# Altium footprint library IDETEC.PcbLib: 275 footprints (part 14 of 18)
Each footprint in its own frame and in the unit in brackets; x right, y up, seen from the top. Pads: shape width x height; smd on the part's side, far side on the other; paste and mask are expansions set on the pad; w line width, h text height; cw(c..) or ccw(c..) is an arc to the next point about the centre after c.
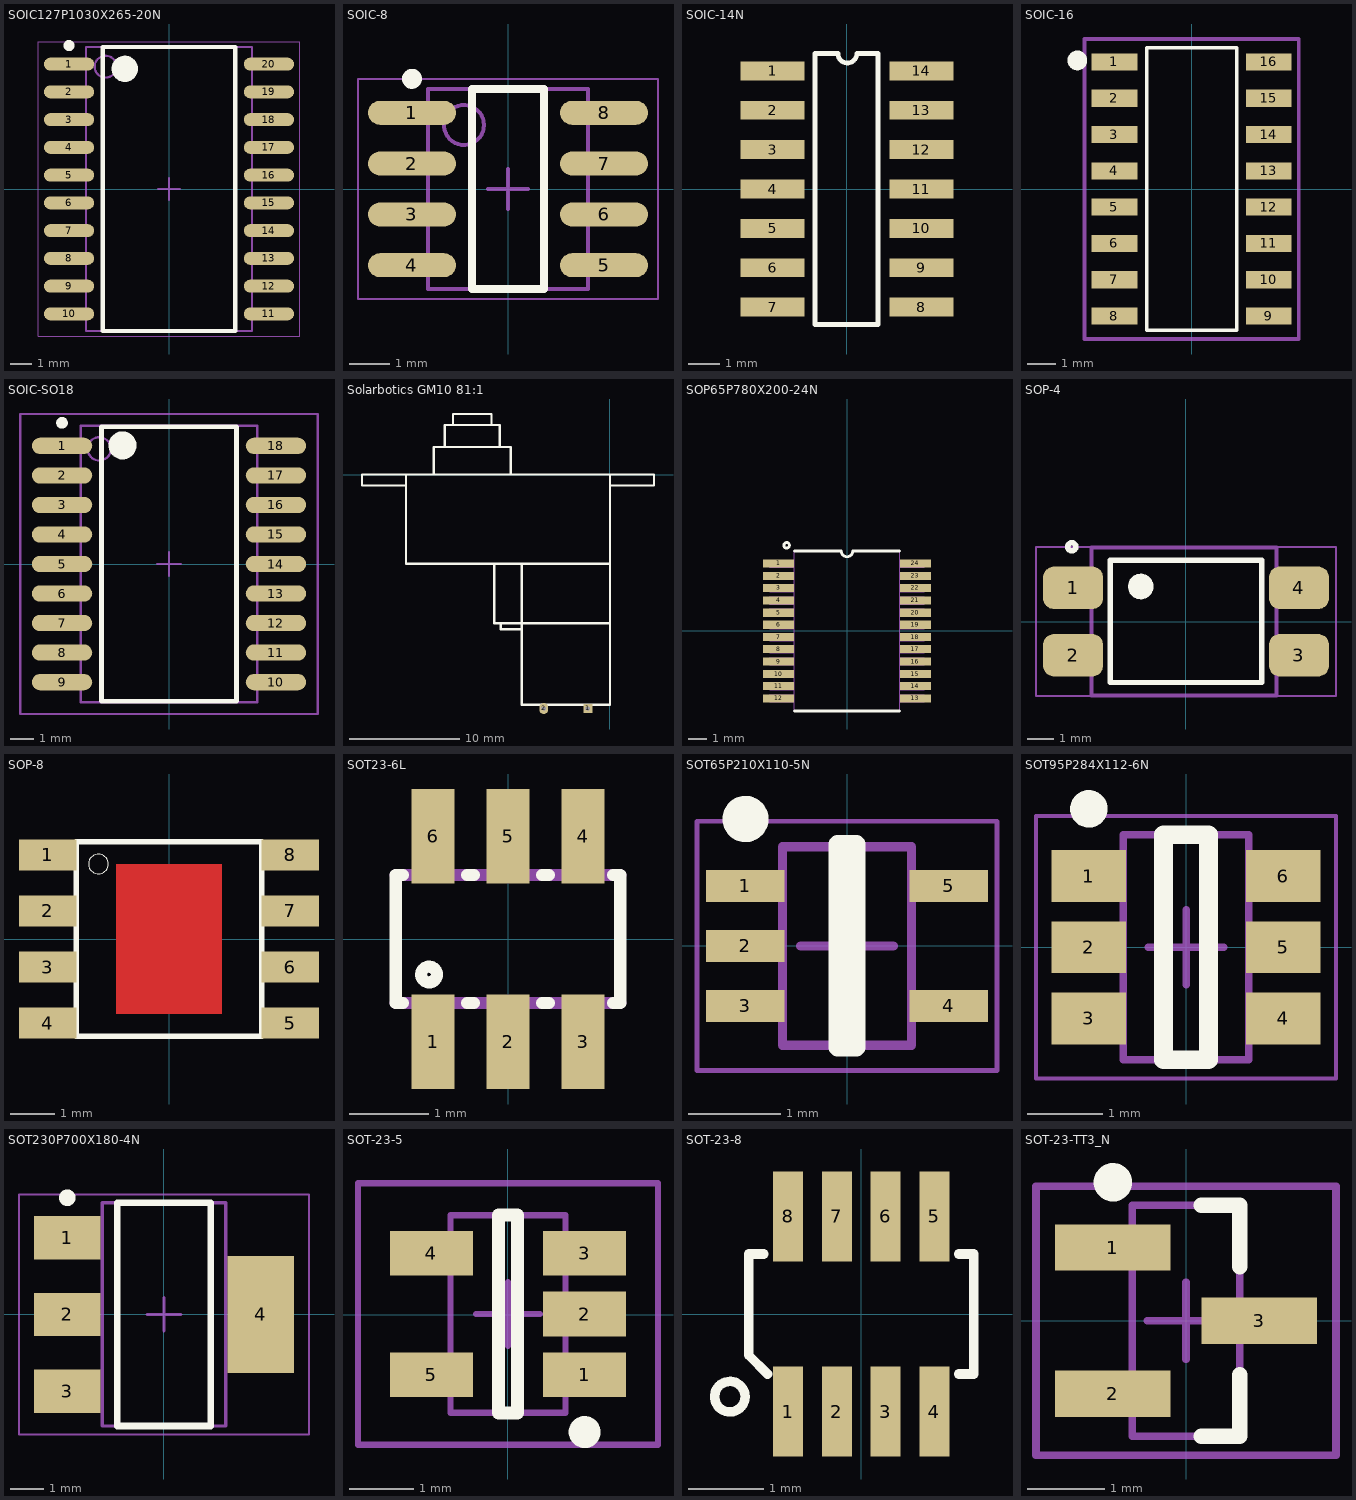
[diagram p13: the footprints below, top view; thin cyan lines are the x and y axes]

## SOIC127P1030X265-20N [mm] "SOIC, 20-Leads, Body 12,80x7,50mm, Pitch 1,27mm, IPC Medium Density"
height 2.65
pads (20):
  oval 2.3x0.6 smd: 1(-4.575,5.715) 2(-4.575,4.445) 3(-4.575,3.175) 4(-4.575,1.905) 5(-4.575,0.635) 6(-4.575,-0.635) 7(-4.575,-1.905) 8(-4.575,-3.175) 9(-4.575,-4.445) 10(-4.575,-5.715) 11(4.575,-5.715) 12(4.575,-4.445) 13(4.575,-3.175) 14(4.575,-1.905) 15(4.575,-0.635) 16(4.575,0.635) 17(4.575,1.905) 18(4.575,3.175) 19(4.575,4.445) 20(4.575,5.715)
Top Overlay:
  circle w0.6: c-2.025,5.5 r0.3
  circle w0.25: c-4.575,6.565 r0.125
  lines w0.2: -3.025,-6.5 3.025,-6.5 3.025,6.5 -3.025,6.5 -3.025,-6.5
Mechanical 13:
  circle w0.1: c-2.9,5.6 r0.5
  lines w0.1: -3.8,-6.5 3.8,-6.5 3.8,6.5 -3.8,6.5 -3.8,-6.5
Mechanical 15:
  lines w0.05: -5.975,-6.75 5.975,-6.75 5.975,6.75 -5.975,6.75 -5.975,-6.75
  lines w0.1: -0.5,0 0.5,0 ; 0,-0.5 0,0.5
3D body "User Library-SOIC20_JEDEC_MS-013AC.STEP": height 2.66, standoff 0, extent -5.29,-6.5 5.34,6.5

## SOIC-8 [mm] "SOIC, 8-Leads, Body 4,90x3,90mm, Pitch 1,27mm, IPC Medium Density"
height 1.35
pads (8):
  oval 2.2x0.6 smd: 1(-2.4,1.905) 2(-2.4,0.635) 3(-2.4,-0.635) 4(-2.4,-1.905) 5(2.4,-1.905) 6(2.4,-0.635) 7(2.4,0.635) 8(2.4,1.905)
Top Overlay:
  circle w0.25: c-2.4,2.755 r0.125
  lines w0.2: -0.9,-2.5 0.9,-2.5 0.9,2.5 -0.9,2.5 -0.9,-2.5
Mechanical 13:
  circle w0.1: c-1.1,1.6 r0.5
  lines w0.1: -2,-2.5 2,-2.5 2,2.5 -2,2.5 -2,-2.5
Mechanical 15:
  lines w0.05: -3.75,-2.75 3.75,-2.75 3.75,2.75 -3.75,2.75 -3.75,-2.75
  lines w0.1: -0.5,0 0.5,0 ; 0,-0.5 0,0.5
3D body "User Library-si9986.STEP": height 1.7, standoff -0.05, extent -3.101,-2.5 3.101,2.5

## SOIC-14N [mil]
pads (14):
  rect 81x24 smd: 1(-94,150) 2(-94,100) 3(-94,50) 4(-94,0) 5(-94,-50) 6(-94,-100) 7(-94,-150) 8(95,-150) 9(95,-100) 10(95,-50) 11(95,0) 12(95,50) 13(95,100) 14(95,150)
Top Overlay:
  lines w0: -11,172 ccw(c1,172) 13,172
  lines w5.98: -11,172 ccw(c1,172) 13,172
  lines w6: -11,172 -40,172 -40,-172 40,-172 40,172 13,172
3D body "User Library-so14-1.STEP": height 66.93, standoff 0, extent -118.11,-173.22 118.11,173.23

## SOIC-16 [mm]
pads (16):
  rect 1.6x0.6 smd: 1(-2.7,4.445) 2(-2.7,3.175) 3(-2.7,1.905) 4(-2.7,0.635) 5(-2.7,-0.635) 6(-2.7,-1.905) 7(-2.7,-3.175) 8(-2.7,-4.445) 9(2.7,-4.445) 10(2.7,-3.175) 11(2.7,-1.905) 12(2.7,-0.635) 13(2.7,0.635) 14(2.7,1.905) 15(2.7,3.175) 16(2.7,4.445)
Top Overlay:
  circle w0.406: c-4,4.5 r0.141
  lines w0.127: -1.575,-4.95 1.575,-4.95 1.575,4.95 -1.575,4.95 -1.575,-4.95
Mechanical 27:
  lines w0.127: -3.75,-5.25 -3.75,5.25 3.75,5.25 3.75,-5.25 -3.75,-5.25
3D body "User Library-so16.STEP": height 1.7, standoff 0, extent -3,-5.1 3,5.1

## SOIC-SO18 [mm] "SOIC-SO18"
pads (18):
  oval 2.6x0.7 smd: 1(-4.6,5.08) 2(-4.6,3.81) 3(-4.6,2.54) 4(-4.6,1.27) 5(-4.6,0) 6(-4.6,-1.27) 7(-4.6,-2.54) 8(-4.6,-3.81) 9(-4.6,-5.08) 10(4.6,-5.08) 11(4.6,-3.81) 12(4.6,-2.54) 13(4.6,-1.27) 14(4.6,0) 15(4.6,1.27) 16(4.6,2.54) 17(4.6,3.81) 18(4.6,5.08)
Top Overlay:
  circle w0.25: c-4.6,6.07 r0.125
  circle w0.6: c-2,5.1 r0.3
  lines w0.2: -2.9,-5.9 2.9,-5.9 2.9,5.9 -2.9,5.9 -2.9,-5.9
Mechanical 13:
  circle w0.1: c-3,4.95 r0.5
  lines w0.1: -3.8,-5.95 3.8,-5.95 3.8,5.95 -3.8,5.95 -3.8,-5.95
Mechanical 15:
  lines w0.1: -0.5,0 0.5,0 ; 0,-0.5 0,0.5 ; -6.4,-6.45 6.4,-6.45 6.4,6.45 -6.4,6.45 -6.4,-6.45
3D body "SW3dPS-SOIC18-300.STEP": height 2.65, standoff 0, extent -5.15,-5.765 5.15,5.765

## Solarbotics GM10 81:1 [mm] "mini motor de pololu"
height 12.1
pads (2):
  rect 0.8x0.8 hole 0.4: 1(-2,-21.24)
  oval 0.8x1 hole 0.4: 2(-6,-21.24)
Top Overlay:
  lines w0.2: -16,0 -16,2.5 -9,2.5 -9,0 ; -15,3.01 -15,2.5 -15,4.5 -10,4.5 -10,2.5 ; -14.25,4.5 -14.25,5.5 -10.75,5.5 -10.75,4.5 ; -10.49,-13.5 -8,-13.5 ; -10.49,-13.49 -10.49,-8.11 ; -8,-14.04 -9.9,-14.04 -9.9,-13.5 -8,-13.5 ; -8,-8.1 -8,-20.9 0,-20.9 0,-8.1 ; -0.03,-13.5 -8,-13.5 ; -18.5,-1 -18.5,0 ; -18.5,-1 -18.5,-8.1 0,-8.1 ; -18.5,-1 -22.5,-1 -22.5,0 -18.5,0 ; -18.5,0 0,0 ; 0,-8.1 0,-1 ; 0,-1 4,-1 4,0 0,0 ; 0,-1 0,0
3D body "User Library-gm10A.STEP": height 13.14, standoff 0, extent -22.502,-20.949 3.998,5.451

## SOP65P780X200-24N [mil]
pads (24):
  rect 65x17 smd: 1(-143,141) 2(-143,115) 3(-143,90) 4(-143,64) 5(-143,38) 6(-143,13) 7(-143,-13) 8(-143,-38) 9(-143,-64) 10(-143,-90) 11(-143,-115) 12(-143,-141) 13(143,-141) 14(143,-115) 15(143,-90) 16(143,-64) 17(143,-38) 18(143,-13) 19(143,13) 20(143,38) 21(143,64) 22(143,90) 23(143,115) 24(143,141)
Top Overlay:
  circle w5.91: c-126.22,178.9 r5.79
  lines w6: -110,-167 110,-167 ; -110,167 -12,167 ccw(c0,167) 12,167 110,167
Mechanical 16:
  lines w0: -12,167 -110,167 -110,-167 110,-167 110,167 12,167 ; -161,-148 -110,-148 -110,-133 -161,-133 -161,-148 ; -161,-123 -110,-123 -110,-108 -161,-108 -161,-123 ; -161,-97 -110,-97 -110,-82 -161,-82 -161,-97 ; -161,-71 -110,-71 -110,-56 -161,-56 -161,-71 ; -161,-46 -110,-46 -110,-31 -161,-31 -161,-46 ; -161,-20 -110,-20 -110,-5 -161,-5 -161,-20 ; -161,5 -110,5 -110,20 -161,20 -161,5 ; -161,31 -110,31 -110,46 -161,46 -161,31 ; -161,56 -110,56 -110,71 -161,71 -161,56 ; -161,82 -110,82 -110,97 -161,97 -161,82 ; -161,108 -110,108 -110,123 -161,123 -161,108 ; -161,133 -110,133 -110,148 -161,148 -161,133 ; 110,-148 161,-148 161,-133 110,-133 110,-148 ; 110,-123 161,-123 161,-108 110,-108 110,-123 ; 110,-97 161,-97 161,-82 110,-82 110,-97 ; 110,-71 161,-71 161,-56 110,-56 110,-71 ; 110,-46 161,-46 161,-31 110,-31 110,-46 ; 110,-20 161,-20 161,-5 110,-5 110,-20 ; 110,5 161,5 161,20 110,20 110,5 ; 110,31 161,31 161,46 110,46 110,31 ; 110,56 161,56 161,71 110,71 110,56 ; 110,82 161,82 161,97 110,97 110,82 ; 110,108 161,108 161,123 110,123 110,108 ; 110,133 161,133 161,148 110,148 110,133
3D body "User Library-SSOP 24 PIN_.STEP": height 70.13, standoff -8.18, extent -155.5,-169.88 155.52,169.89

## SOP-4 [mil]
pads (4):
  rrect50% 89x63 smd: 1(-167.32,50) 2(-167.32,-50) 3(168,-50) 4(168,50)
Top Overlay:
  circle w8: c-169.29,111 r6
  circle w8: c-66.93,52 r15
  rectangle: -78.78,40 -55.12,63
  lines w8: -112.2,-90.55 -112.2,91 113,91 113,-90.55 -112.2,-90.55
Mechanical 15:
  lines w5.91: -140,-110 -140,110 135,110 135,-110 -140,-110
Mechanical 27:
  lines w3: -222.44,-110.24 -222.44,111 223,111 223,-110.24 -222.44,-110.24
3D body "User Library-PC817_Gullwing.STEP": height 151.57, standoff -0.06, extent -196.85,-90.16 196.86,90.16

## SOP-8 [mm]
pads (8):
  rect 1.3x0.7 smd: 1(-2.75,1.905) 2(-2.75,0.635) 3(-2.75,-0.635) 4(-2.75,-1.905) 5(2.75,-1.905) 6(2.75,-0.635) 7(2.75,0.635) 8(2.75,1.905)
Top Layer:
  rectangle: -1.2,-1.7 1.2,1.7
Top Overlay:
  circle w0: c-1.6,1.7 r0.224
  lines w0.127: -2.1,-2.2 2.1,-2.2 2.1,2.2 -2.1,2.2 -2.1,-2.2
3D body "User Library-SOP8.STEP": height 1.76, standoff 0, extent -3.126,-2.532 3.127,2.532

## SOT23-6L [mm] "SOT23-6L"
pads (6):
  rect 0.55x1.2 smd: 1(-0.95,-1.3) 2(0,-1.3) 3(0.95,-1.3) 4(0.95,1.3) 5(0,1.3) 6(-0.95,1.3)
Top Overlay:
  circle w0.152: c-1,-0.45 r0.1
  lines w0.152: -1.328,-0.81 -1.422,-0.81 -1.422,0.81 -1.328,0.81 ; -0.522,-0.81 -0.428,-0.81 ; -0.522,0.81 -0.428,0.81 ; 0.428,-0.81 0.522,-0.81 ; 0.428,0.81 0.522,0.81 ; 1.328,-0.81 1.422,-0.81 1.422,0.81 1.328,0.81
Mechanical 16:
  rectangle: -1.2,-1.5 -0.7,-0.85
  rectangle: -0.25,-1.5 0.25,-0.85
  rectangle: 0.7,-1.5 1.2,-0.85
  rectangle: 0.7,0.85 1.2,1.5
  rectangle: -0.25,0.85 0.25,1.5
  rectangle: -1.2,0.85 -0.7,1.5
  lines w0.152: -1.422,-0.81 1.422,-0.81 ; -1.422,0.81 1.422,0.81
3D body "User Library-SOT-23-6L.STEP": height 1.3, standoff -0.1, extent -1.524,-1.504 1.524,1.496

## SOT65P210X110-5N [mm] "SOT23, 5-Leads, Body 2,00x2,10mm, Pitch 0,65mm, IPC Medium Density"
height 1.1
pads (5):
  rect 0.85x0.35 smd: 1(-1.1,0.65) 2(-1.1,0) 3(-1.1,-0.65) 4(1.1,-0.65) 5(1.1,0.65)
Top Overlay:
  circle w0.25: c-1.1,1.375 r0.125
  lines w0.2: -0.1,-1.1 -0.1,1.1 0.1,1.1 0.1,-1.1 -0.1,-1.1
Mechanical 13:
  lines w0.1: -0.7,-1.075 0.7,-1.075 0.7,1.075 -0.7,1.075 -0.7,-1.075
Mechanical 15:
  lines w0.05: -1.625,-1.35 1.625,-1.35 1.625,1.35 -1.625,1.35 -1.625,-1.35
  lines w0.1: -0.5,0 0.5,0 ; 0,-0.5 0,0.5
3D body "User Library-DCK(R-PDSO-G6).STEP": height 1.1, standoff 0, extent -1.1,-1 1.1,1

## SOT95P284X112-6N [mm] "SOT23, 6-Leads, Body 2,92x2,84mm, Pitch 0,95mm, IPC Medium Density"
height 1.12
pads (6):
  rect 0.99x0.69 smd: 1(-1.295,0.95) 2(-1.295,0) 3(-1.295,-0.95) 4(1.295,-0.95) 5(1.295,0) 6(1.295,0.95)
Top Overlay:
  circle w0.25: c-1.295,1.845 r0.125
  lines w0.25: -0.3,-1.5 -0.3,1.5 0.3,1.5 0.3,-1.5 -0.3,-1.5
Mechanical 13:
  lines w0.1: -0.84,-1.5 0.84,-1.5 0.84,1.5 -0.84,1.5 -0.84,-1.5
Mechanical 15:
  lines w0.05: -2,-1.75 2,-1.75 2,1.75 -2,1.75 -2,-1.75
  lines w0.1: -0.5,0 0.5,0 ; 0,-0.5 0,0.5
3D body "User Library-SSOT-6.STEP": height 1.05, standoff 0, extent -1.498,-1.51 1.502,1.49

## SOT230P700X180-4N [mm] "SOT223, 4-Leads, Body 6,50x7,00mm (avg), Pitch 2,30mm, IPC Medium Density"
height 1.8
pads (4):
  rect 2x1.3 smd: 1(-2.9,2.3) 2(-2.9,0) 3(-2.9,-2.3)
  rect 2x3.5 smd: 4(2.9,0)
Top Overlay:
  circle w0.25: c-2.9,3.5 r0.125
  lines w0.2: -1.4,-3.35 -1.4,3.35 1.4,3.35 1.4,-3.35 -1.4,-3.35
Mechanical 13:
  lines w0.1: -1.85,-3.35 -1.85,3.35 1.85,3.35 1.85,-3.35 -1.85,-3.35
Mechanical 15:
  lines w0.05: -4.35,-3.6 -4.35,3.6 4.35,3.6 4.35,-3.6 -4.35,-3.6
  lines w0.1: -0.5,0 0.5,0 ; 0,-0.5 0,0.5
3D body "User Library-SOT-223-2.STEP": height 1.85, standoff -0.05, extent -3.574,-3.348 3.63,3.352

## SOT-23-5 [mm] "SOT-23-5"
pads (5):
  rect 1.3x0.7 smd: 1(1.202,-0.938) 2(1.202,0.012) 3(1.202,0.962) 4(-1.198,0.962) 5(-1.198,-0.938)
Top Overlay:
  circle w0.25: c1.202,-1.838 r0.125
  lines w0.2: -0.148,-1.538 -0.148,1.562 0.152,1.562 0.152,-1.538 -0.148,-1.538
Mechanical 13:
  lines w0.1: -0.898,-1.538 0.902,-1.538 0.902,1.562 -0.898,1.562 -0.898,-1.538
Mechanical 15:
  lines w0.1: -0.498,0.012 0.502,0.012 ; 0.002,-0.488 0.002,0.512 ; -2.348,-2.038 2.352,-2.038 2.352,2.062 -2.348,2.062 -2.348,-2.038
3D body "User Library-SOT-23-5-1.STEP": height 1.1, standoff 0, extent -1.25,-1.5 1.25,1.5

## SOT-23-8 [mm]
pads (8):
  rect 0.4x1.2 smd paste-25.4 mask-25.4: 1(-0.975,-1.3) 2(-0.325,-1.3) 3(0.325,-1.3) 4(0.975,-1.3) 5(0.975,1.3) 6(0.325,1.3) 7(-0.325,1.3) 8(-0.975,1.3)
Top Overlay:
  circle w0.127: c-1.752,-1.102 r0.203
  lines w0.127: -1.3,0.8 -1.5,0.8 -1.5,-0.55 -1.25,-0.8 ; 1.3,-0.8 1.5,-0.8 1.5,0.8 1.3,0.8
Top Paste:
  region: -0.775,0.7 -0.775,1.9 -1.175,1.9 -1.175,0.7
  region: -0.125,0.7 -0.125,1.9 -0.525,1.9 -0.525,0.7
  region: 0.525,0.7 0.525,1.9 0.125,1.9 0.125,0.7
  region: 1.175,0.7 1.175,1.9 0.775,1.9 0.775,0.7
  region: 1.175,-1.9 1.175,-0.7 0.775,-0.7 0.775,-1.9
  region: 0.525,-1.9 0.525,-0.7 0.125,-0.7 0.125,-1.9
  region: -0.125,-1.9 -0.125,-0.7 -0.525,-0.7 -0.525,-1.9
  region: -0.775,-1.9 -0.775,-0.7 -1.175,-0.7 -1.175,-1.9
Top Solder:
  region: -0.675,0.6 -0.675,2 -1.275,2 -1.275,0.6
  region: -0.025,0.6 -0.025,2 -0.625,2 -0.625,0.6
  region: 0.625,0.6 0.625,2 0.025,2 0.025,0.6
  region: 1.275,0.6 1.275,2 0.675,2 0.675,0.6
  region: 1.275,-2 1.275,-0.6 0.675,-0.6 0.675,-2
  region: 0.625,-2 0.625,-0.6 0.025,-0.6 0.025,-2
  region: -0.025,-2 -0.025,-0.6 -0.625,-0.6 -0.625,-2
  region: -0.675,-2 -0.675,-0.6 -1.275,-0.6 -1.275,-2
3D body "User Library-sot238.STEP": height 1.2, standoff 0, extent -1.453,-1.4 1.487,1.4

## SOT-23-TT3_N [mm] "SOT23, 3-Leads, Body 2.9x1.3mm, Pitch 0.95mm, Lead Span 2.4mm, IPC Medium Density"
height 1.12
pads (3):
  rect 1.5x0.6 smd: 1(-0.95,0.95) 2(-0.95,-0.95) 3(0.95,0)
Top Overlay:
  circle w0.25: c-0.95,1.8 r0.125
  lines w0.2: 0.2,-1.5 0.7,-1.5 0.7,-0.7 ; 0.2,1.5 0.7,1.5 0.7,0.7
Mechanical 13:
  lines w0.1: -0.7,-1.5 0.7,-1.5 0.7,1.5 -0.7,1.5 -0.7,-1.5
Mechanical 15:
  lines w0.1: -0.5,0 0.5,0 ; 0,-0.5 0,0.5 ; -1.95,-1.75 1.95,-1.75 1.95,1.75 -1.95,1.75 -1.95,-1.75
3D body "User Library-SOT-23-3-1.STEP": height 1.1, standoff 0, extent -1.271,-1.5 1.271,1.5